# Altium footprint library Horizont_11_12_2017.PcbLib: 257 footprints (part 1 of 17)
Each footprint in its own frame and in the unit in brackets; x right, y up, seen from the top. Pads: shape width x height; smd on the part's side, far side on the other; paste and mask are expansions set on the pad; w line width, h text height; cw(c..) or ccw(c..) is an arc to the next point about the centre after c.
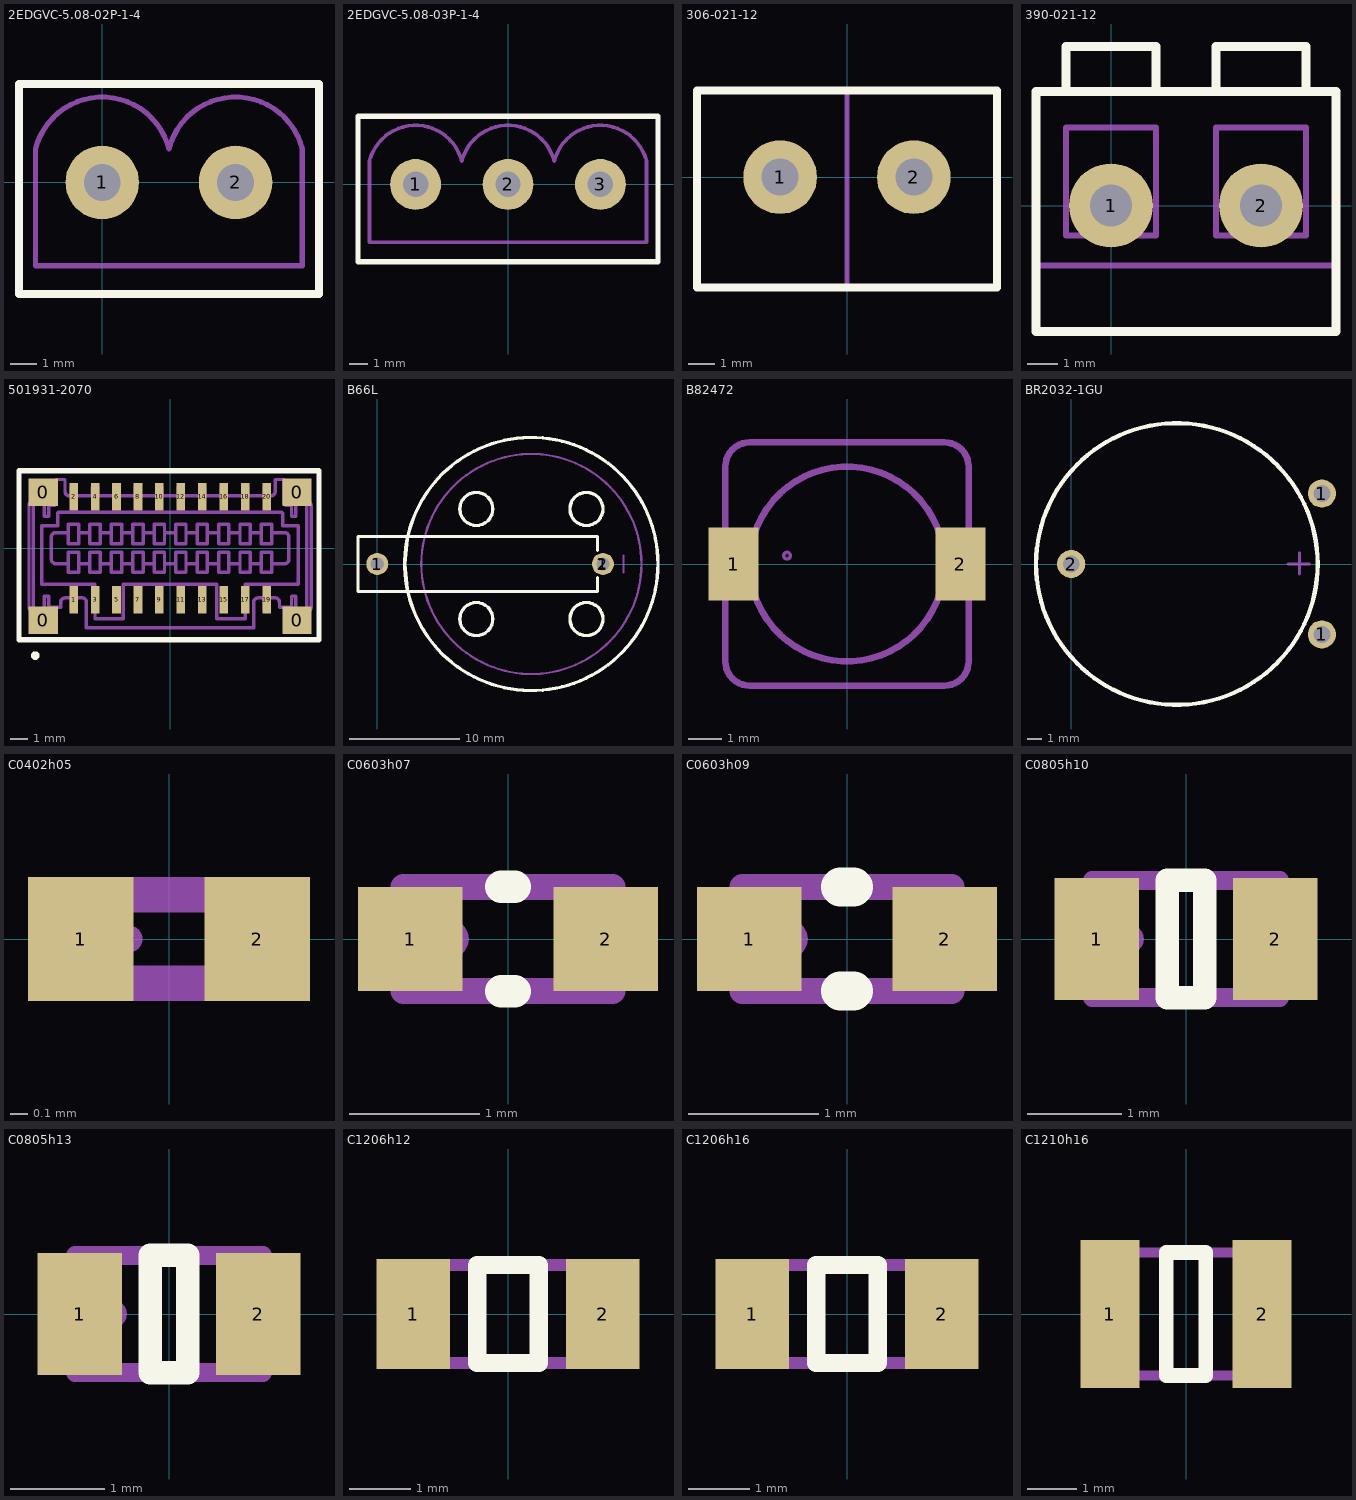
[diagram p0: the footprints below, top view; thin cyan lines are the x and y axes]

## 2EDGVC-5.08-02P-1-4 [mm]
height 11.9
pads (2):
  round 2.8 hole 1.4: 1(0,0) 2(5.08,0)
Top Overlay:
  lines w0.3: -3.17,-4.25 -3.17,3.75 8.255,3.75 8.255,-4.25 -3.14,-4.25
Mechanical 1:
  lines w0.2: -3.17,-4.25 -3.17,3.75 8.25,3.75 8.25,-4.25 -3.17,-4.25 ; -2.54,-3.175 7.62,-3.175 7.62,1.27 ccw(c5.08,0.635) 2.54,1.27 ccw(c0,0.635) -2.54,1.27 -2.54,-3.175
  text "2" at 4.83,-0.5 h1.5
  text ".Designator" at -0.02,-2.6 h1.5
  text "1" at 0,-0.5 h1.5
3D body "2EDGVС-2.STEP": height 12, standoff -3.5, extent -3.14,-4.25 8.22,3.75

## 2EDGVC-5.08-03P-1-4 [mm]
height 11.9
pads (3):
  round 2.8 hole 1.4: 1(-5.08,0) 2(0,0) 3(5.08,0)
Top Overlay:
  lines w0.3: -8.25,-4.25 -8.25,3.75 8.25,3.75 8.25,-4.25 -8.22,-4.25
Mechanical 1:
  lines w0.2: -8.25,-4.25 8.25,-4.25 8.25,3.75 -8.25,3.75 -8.25,-4.25 ; -7.62,-3.175 -7.62,1.27 cw(c-5.08,0.635) -2.54,1.27 cw(c0,0.635) 2.54,1.27 cw(c5.08,0.635) 7.62,1.27 7.62,-3.175 -7.62,-3.175
  text "1" at -5.08,-0.5 h1.5
  text ".Designator" at -1.905,-2.54 h1.5
  text "3" at 4.826,-0.508 h1.5
3D body "2EDGVС-3.STEP": height 12, standoff -3.5, extent -8.22,-4.25 8.22,3.75

## 306-021-12 [mm]
height 10
pads (2):
  round 2.8 hole 1.4: 1(-2.54,0) 2(2.54,0)
Top Overlay:
  lines w0.3: -5.7,-4.2 5.7,-4.2 5.7,3.3 -5.7,3.3 -5.7,-4.2
Mechanical 1:
  lines w0.2: 0,-4.2 0,3.3 ; -5.7,-4.2 -5.7,3.3 5.7,3.3 5.7,-4.2 -5.7,-4.2
  text "2" at 2.29,-0.5 h1.5
  text ".Designator" at -3.2,-5.6 h1.5
  text "1" at -2.54,-0.5 h1.5
3D body "306-021-12.STEP": height 9.95, standoff -3.4, extent -5.68,-4.2 5.68,3.3

## 390-021-12 [mm]
height 13
pads (2):
  round 2.8 hole 1.4: 1(0,0) 2(5,0)
Top Overlay:
  lines w0.3: -1.5,3.8 -1.5,5.3 1.4,5.3 1.5,5.3 1.5,3.8 ; 3.5,3.8 3.5,5.3 6.4,5.3 6.5,5.3 6.5,3.8 ; -2.5,-4.2 7.5,-4.2 7.5,3.8 -2.5,3.8 -2.5,-4.2
Mechanical 1:
  lines w0.2: -2.5,-2 7.5,-2 ; -1.5,3.8 -1.5,5.3 1.5,5.3 1.5,3.8 ; 3.5,3.8 3.5,5.3 6.5,5.3 6.5,3.8 ; -2.5,-4.2 -2.5,3.8 7.5,3.8 7.5,-4.2 -2.5,-4.2 ; -1.5,-1 1.5,-1 1.5,2.6 -1.5,2.6 -1.5,-1 ; 3.5,-1 3.5,2.6 6.5,2.6 6.5,-1 3.5,-1
  text "2" at 4.79,-0.5 h1.5
  text ".Designator" at -0.7,-5.6 h1.5
  text "1" at -0.04,-0.5 h1.5
3D body "390-021-12.STEP": height 13, standoff -3, extent -2.5,-5.2 7.5,5.3

## 501931-2070 [mm]
height 8.8
pads (24):
  rect 1.7x1.6 smd: 0(-7.4,-4.2) 0(-7.4,3.25) 0(7.4,-4.2) 0(7.4,3.25)
  rect 0.5x1.6 smd: 1(-5.625,-3) 2(-5.625,3) 3(-4.375,-3) 4(-4.375,3) 5(-3.125,-3) 6(-3.125,3) 7(-1.875,-3) 8(-1.875,3) 9(-0.625,-3) 10(-0.625,3) 11(0.625,-3) 12(0.625,3) 13(1.875,-3) 14(1.875,3) 15(3.125,-3) 16(3.125,3) 17(4.375,-3) 18(4.375,3) 19(5.625,-3) 20(5.625,3)
Top Overlay:
  circle w0.3: c-7.859,-6.263 r0.1
  lines w0.3: -8.809,-5.342 -8.809,4.513 8.675,4.513 8.675,-5.342 -8.809,-5.342
Mechanical 1:
  drawing of 422 lines, arcs and shapes, not listed
  text ".Designator" at -2.002,4.329 h1.5
  text "19" at 8.632,-1.645 h1.5
  text "1" at -9.06,-1.646 h1.5
  text "20" at 8.599,0.275 h1.5
  text "2" at -9.258,0.374 h1.5
3D body "5019312070.STEP": height 8.8, standoff -0.03, extent -8.275,-4.85 8.275,4

## B66L [mm]
height 5.6
pads (3):
  round 2 hole 1.2: 1(0,0) 2(20.5,0)
  round 1.778 hole 0.032 mask+0.051: 1(20.5,0)
Top Overlay:
  circle w0.3: c14,0 r11.5
  lines w0.3: 2.721,-2.244 2.5,0 2.721,2.244 ; 20,-1.25 20,-2.5 -1.75,-2.5 -1.75,2.5 20,2.5 20,1.25 ; 7.5,-5 7.529,-4.707 7.614,-4.426 7.753,-4.167 7.939,-3.939 8.167,-3.753 8.426,-3.614 8.707,-3.529 9,-3.5 9.293,-3.529 9.574,-3.614 9.833,-3.753 10.061,-3.939 10.247,-4.167 10.386,-4.426 10.471,-4.707 10.5,-5 10.471,-5.293 10.386,-5.574 10.247,-5.833 10.061,-6.061 9.833,-6.247 9.574,-6.386 9.293,-6.471 9,-6.5 8.707,-6.471 8.426,-6.386 8.167,-6.247 7.939,-6.061 7.753,-5.833 7.614,-5.574 7.529,-5.293 7.5,-5 ; 7.5,5 7.529,5.293 7.614,5.574 7.753,5.833 7.939,6.061 8.167,6.247 8.426,6.386 8.707,6.471 9,6.5 9.293,6.471 9.574,6.386 9.833,6.247 10.061,6.061 10.247,5.833 10.386,5.574 10.471,5.293 10.5,5 10.471,4.707 10.386,4.426 10.247,4.167 10.061,3.939 9.833,3.753 9.574,3.614 9.293,3.529 9,3.5 8.707,3.529 8.426,3.614 8.167,3.753 7.939,3.939 7.753,4.167 7.614,4.426 7.529,4.707 7.5,5 ; 17.5,-5 17.529,-4.707 17.614,-4.426 17.753,-4.167 17.939,-3.939 18.167,-3.753 18.426,-3.614 18.707,-3.529 19,-3.5 19.293,-3.529 19.574,-3.614 19.833,-3.753 20.061,-3.939 20.247,-4.167 20.386,-4.426 20.471,-4.707 20.5,-5 20.471,-5.293 20.386,-5.574 20.247,-5.833 20.061,-6.061 19.833,-6.247 19.574,-6.386 19.293,-6.471 19,-6.5 18.707,-6.471 18.426,-6.386 18.167,-6.247 17.939,-6.061 17.753,-5.833 17.614,-5.574 17.529,-5.293 17.5,-5 ; 17.5,5 17.529,5.293 17.614,5.574 17.753,5.833 17.939,6.061 18.167,6.247 18.426,6.386 18.707,6.471 19,6.5 19.293,6.471 19.574,6.386 19.833,6.247 20.061,6.061 20.247,5.833 20.386,5.574 20.471,5.293 20.5,5 20.471,4.707 20.386,4.426 20.247,4.167 20.061,3.939 19.833,3.753 19.574,3.614 19.293,3.529 19,3.5 18.707,3.529 18.426,3.614 18.167,3.753 17.939,3.939 17.753,4.167 17.614,4.426 17.529,4.707 17.5,5
Mechanical 1:
  circle w0.2: c14,0 r11.5
  circle w0.2: c14,0 r10
  lines w0.2: -0.8,-0.025 0.7,-0.025 ; 0,-0.725 0,0.775 ; 2.75,-2.5 -1.75,-2.5 -1.75,2.5 2.75,2.5 ; 22.375,-0.75 22.375,0.75
  text ".Designator" at 10.5,-0.25 h1.5
3D body "B66L.stp": height 6, standoff -3, extent -1.75,-11.265 25.209,11.265

## B82472 [mm]
height 3.5
pads (2):
  rect 1.5x2.2 smd: 1(-3.4,0) 2(3.4,0)
Mechanical 1:
  circle w0.1: c-1.8,0.25 r0.1
  circle w0.2: c0,0 r2.92
  lines w0.2: -3.65,-2.92 ccw(c-2.92,-2.92) -2.92,-3.65 2.92,-3.65 ccw(c2.92,-2.92) 3.65,-2.92 3.65,2.92 ccw(c2.92,2.92) 2.92,3.65 -2.92,3.65 ccw(c-2.92,2.92) -3.65,2.92 -3.65,-2.92
  text ".Comment" at -2.92,-5.11 h1.5
  text ".Designator" at -0.73,0 h1.5
3D body "B82472.stp": height 3.5, standoff 0, extent -3.65,-3.65 3.65,3.65

## BR2032-1GU [mm]
height 5.6
pads (3):
  round 2 hole 1.2: 1(17.8,-5) 1(17.8,5) 2(0,0)
Top Overlay:
  circle w0.3: c7.5,0 r10
Mechanical 1:
  circle w0.2: c7.5,0 r10
  lines w0.2: 0,-0.8 0,0.7 ; 15.4,0 16.9,0 ; 16.2,-0.7 16.2,0.8
  text ".Designator" at 5.751,0.081 h1.5
3D body "br2032.stp": height 8, standoff -3, extent -2.557,-9.888 18,10.088

## C0402h05 [mm]
height 0.5
pads (2):
  rect 0.6x0.7 smd: 1(-0.5,0) 2(0.5,0)
Mechanical 1:
  circle w0.05: c-0.225,0 r0.05
  lines w0.2: -0.5,-0.25 0.5,-0.25 0.5,0.25 -0.5,0.25 -0.5,-0.25
  text ".Designator" at -0.72,0.7 h1.5
3D body "C0402h05.stp": height 0.55, standoff 0, extent -0.5,-0.25 0.5,0.25

## C0603h07 [mm]
height 0.7
pads (2):
  rect 0.8x0.8 smd: 1(-0.75,0) 2(0.75,0)
Top Overlay:
  lines w0.25: -0.05,-0.4 0.05,-0.4 ; -0.05,0.4 0.05,0.4
Mechanical 1:
  circle w0.1: c-0.45,0 r0.1
  lines w0.2: -0.8,-0.4 0.8,-0.4 0.8,0.4 -0.8,0.4 -0.8,-0.4
  text ".Designator" at -0.72,0.7 h1.5
3D body "C0603h07.stp": height 0.7, standoff 0, extent -0.85,-0.45 0.85,0.45

## C0603h09 [mm]
height 0.9
pads (2):
  rect 0.8x0.8 smd: 1(-0.75,0) 2(0.75,0)
Top Overlay:
  lines w0.3: -0.05,-0.4 0.05,-0.4 ; -0.05,0.4 0.05,0.4
Mechanical 1:
  circle w0.1: c-0.45,0 r0.1
  lines w0.2: -0.8,-0.4 -0.8,0.4 0.8,0.4 0.8,-0.4 -0.8,-0.4
  text ".Designator" at -0.72,0.7 h1.5
3D body "C0603h09.stp": height 0.9, standoff 0, extent -0.85,-0.45 0.85,0.45

## C0805h10 [mm]
height 1
pads (2):
  rect 0.9x1.3 smd: 1(-0.95,0) 2(0.95,0)
Top Overlay:
  lines w0.25: -0.2,-0.625 0.2,-0.625 0.2,0.625 -0.2,0.625 -0.2,-0.625
Mechanical 1:
  circle w0.1: c-0.6,0 r0.1
  lines w0.2: -1,-0.625 -1,0.625 1,0.625 1,-0.625 -1,-0.625
  text ".Designator" at -0.87,0.95 h1.5
3D body "C0805h10.stp": height 1, standoff 0, extent -1.05,-0.675 1.05,0.675

## C0805h13 [mm]
height 1.3
pads (2):
  rect 0.9x1.3 smd: 1(-0.95,0) 2(0.95,0)
Top Overlay:
  lines w0.25: -0.2,-0.625 0.2,-0.625 0.2,0.625 -0.2,0.625 -0.2,-0.625
Mechanical 1:
  circle w0.1: c-0.6,0 r0.1
  lines w0.2: -1,-0.625 -1,0.625 1,0.625 1,-0.625 -1,-0.625
  text ".Designator" at -0.87,0.95 h1.5
3D body "C0805h13.stp": height 1.3, standoff 0, extent -1.05,-0.675 1.05,0.675

## C1206h12 [mm]
height 1.2
pads (2):
  rect 1.2x1.8 smd: 1(-1.55,0) 2(1.55,0)
Top Overlay:
  lines w0.3: -0.5,-0.8 0.5,-0.8 0.5,0.8 -0.5,0.8 -0.5,-0.8
Mechanical 1:
  circle w0.1: c-1.15,0 r0.1
  lines w0.2: -1.6,-0.8 1.6,-0.8 1.6,0.8 -1.6,0.8 -1.6,-0.8
  text ".Designator" at -1.22,1.2 h1.5
3D body "C1206h12.stp": height 1.2, standoff 0, extent -1.675,-0.9 1.675,0.9

## C1206h16 [mm]
height 1.6
pads (2):
  rect 1.2x1.8 smd: 1(-1.55,0) 2(1.55,0)
Top Overlay:
  lines w0.3: -0.5,-0.8 -0.5,0.8 0.5,0.8 0.5,-0.8 -0.5,-0.8
Mechanical 1:
  circle w0.1: c-1.15,0 r0.1
  lines w0.2: -1.6,-0.8 -1.6,0.8 1.6,0.8 1.6,-0.8 -1.6,-0.8
  text ".Designator" at -1.32,1.25 h1.5
3D body "C1206h16.stp": height 1.6, standoff 0, extent -1.675,-0.9 1.675,0.9

## C1210h16 [mm]
height 1.6
pads (2):
  rect 1.2x3 smd: 1(-1.55,0) 2(1.55,0)
Top Overlay:
  lines w0.3: -0.4,-1.25 -0.4,1.25 0.4,1.25 0.4,-1.25 -0.4,-1.25
Mechanical 1:
  circle w0.1: c-1.15,0 r0.1
  lines w0.2: -1.6,-1.25 -1.6,1.25 1.6,1.25 1.6,-1.25 -1.6,-1.25
  text ".Designator" at -1.22,-0.4 h1.5
3D body "C1210h16.stp": height 1.6, standoff 0, extent -1.675,-1.325 1.675,1.325